# Altium footprint library Connector.PcbLib: 536 footprints (part 26 of 34)
Each footprint in its own frame and in the unit in brackets; x right, y up, seen from the top. Pads: shape width x height; smd on the part's side, far side on the other; paste and mask are expansions set on the pad; w line width, h text height; cw(c..) or ccw(c..) is an arc to the next point about the centre after c.
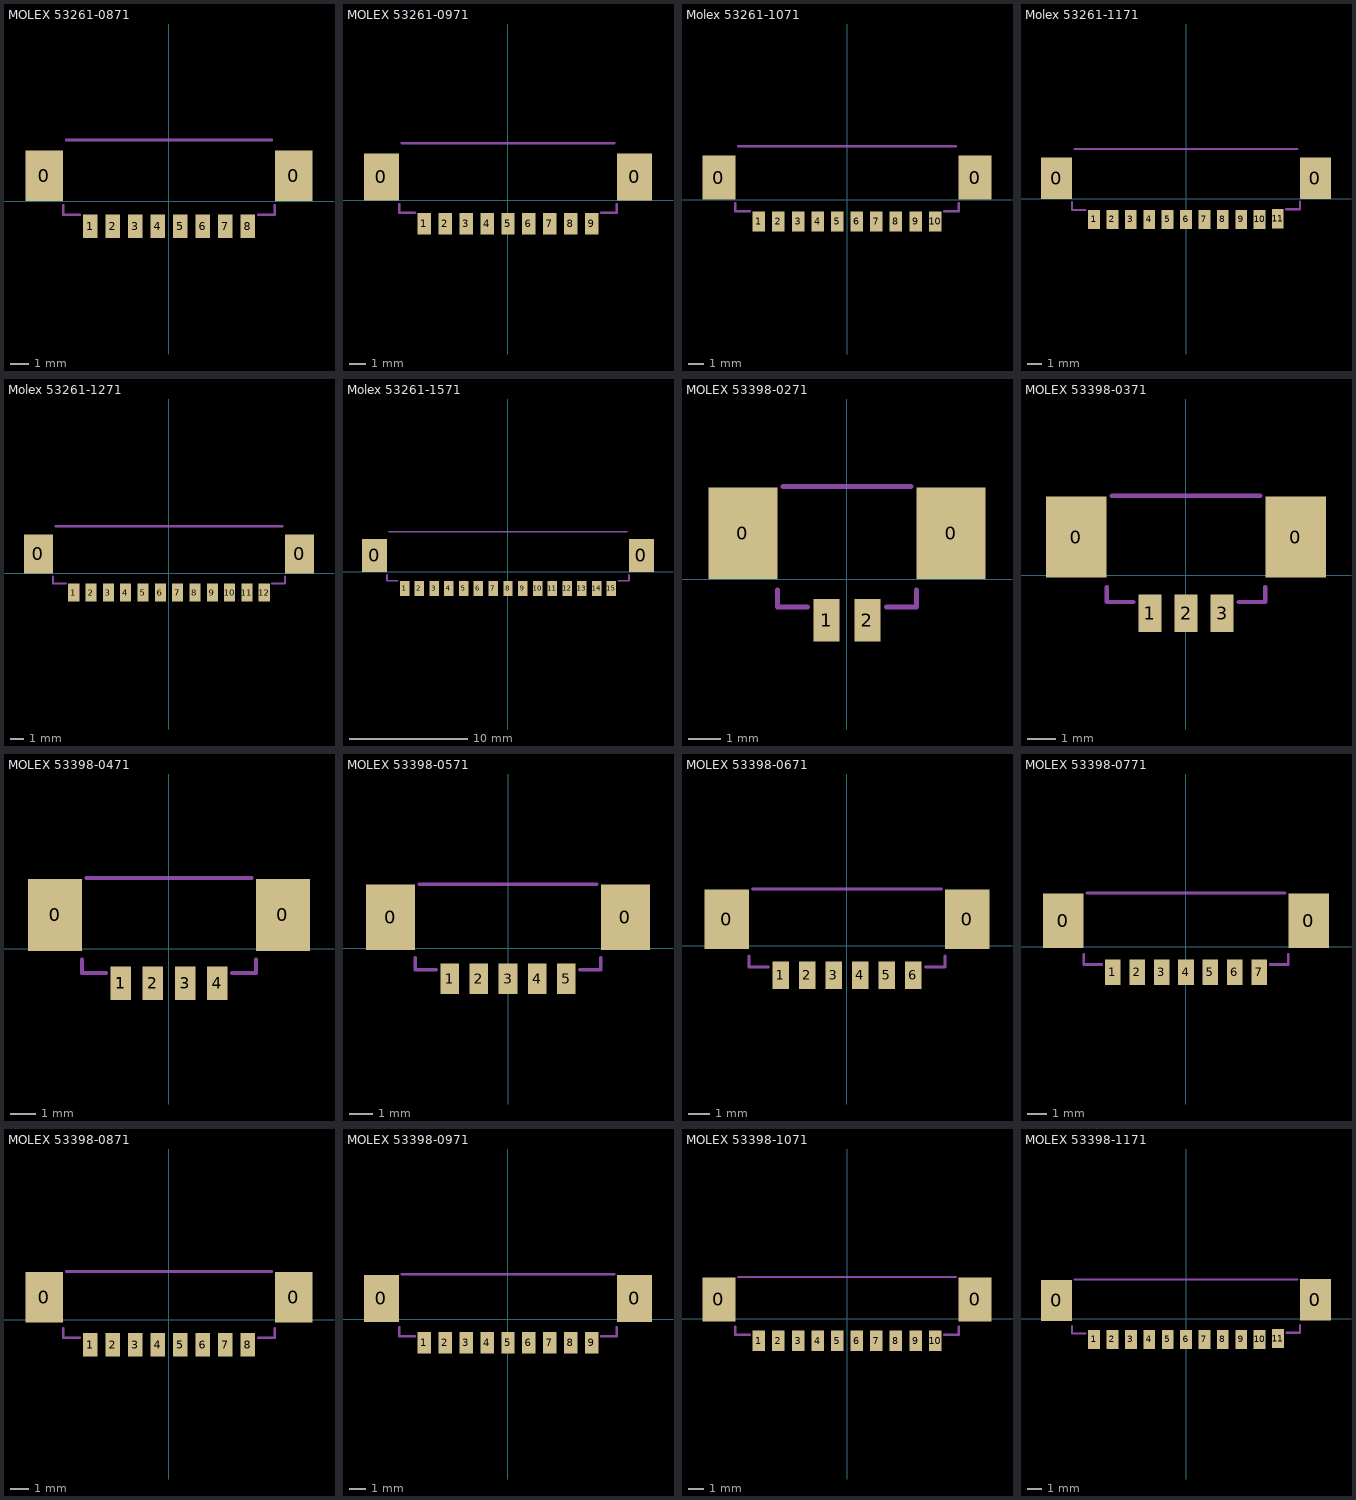
[diagram p25: the footprints below, top view; thin cyan lines are the x and y axes]

## MOLEX 53261-0871 [mm]
pads (10):
  rect 2.1x2.8 smd: 0(-6.925,1.4) 0(6.925,1.4)
  rect 0.8x1.3 smd: 1(-4.375,-1.4) 2(-3.125,-1.4) 3(-1.875,-1.4) 4(-0.625,-1.4) 5(0.625,-1.4) 6(1.875,-1.4) 7(3.125,-1.4) 8(4.375,-1.4)
Mechanical 15:
  lines w0.15: -5.874,-0.232 -5.874,-0.75 -4.95,-0.75 ; -5.7,3.394 5.7,3.394 ; 4.95,-0.75 5.874,-0.75 5.874,-0.232
3D body "532610871.stp": height 3.43, standoff 0.03, extent -7.575,-1.731 7.575,3.469

## MOLEX 53261-0971 [mm]
pads (11):
  rect 2.1x2.8 smd: 0(-7.55,1.4) 0(7.55,1.4)
  rect 0.8x1.3 smd: 1(-5,-1.4) 2(-3.75,-1.4) 3(-2.5,-1.4) 4(-1.25,-1.4) 5(0,-1.4) 6(1.25,-1.4) 7(2.5,-1.4) 8(3.75,-1.4) 9(5,-1.4)
Mechanical 15:
  lines w0.15: -6.499,-0.232 -6.499,-0.75 -5.575,-0.75 ; -6.325,3.394 6.325,3.394 ; 5.575,-0.75 6.499,-0.75 6.499,-0.232
3D body "532610971.stp": height 3.43, standoff 0.03, extent -8.2,-1.731 8.2,3.469

## Molex 53261-1071 [mm]
pads (12):
  rect 2.1x2.8 smd: 0(-8.175,1.4) 0(8.175,1.4)
  rect 0.8x1.3 smd: 1(-5.625,-1.4) 2(-4.375,-1.4) 3(-3.125,-1.4) 4(-1.875,-1.4) 5(-0.625,-1.4) 6(0.625,-1.4) 7(1.875,-1.4) 8(3.125,-1.4) 9(4.375,-1.4) 10(5.625,-1.4)
Mechanical 15:
  lines w0.15: -7.124,-0.232 -7.124,-0.75 -6.2,-0.75 ; -6.95,3.394 6.95,3.394 ; 6.2,-0.75 7.124,-0.75 7.124,-0.232
3D body "532611071.stp": height 3.43, standoff 0.03, extent -8.825,-1.731 8.825,3.469

## Molex 53261-1171 [mm]
pads (13):
  rect 2.1x2.8 smd: 0(-8.8,1.4) 0(8.8,1.4)
  rect 0.8x1.3 smd: 1(-6.25,-1.4) 2(-5,-1.4) 3(-3.75,-1.4) 4(-2.5,-1.4) 5(-1.25,-1.4) 6(0,-1.4) 7(1.25,-1.4) 8(2.5,-1.4) 9(3.75,-1.4) 10(5,-1.4) 11(6.245,-1.349)
Mechanical 15:
  lines w0.15: -7.749,-0.232 -7.749,-0.75 -6.825,-0.75 ; -7.575,3.394 7.575,3.394 ; 6.82,-0.699 7.743,-0.699 7.743,-0.181
3D body "532611171.stp": height 3.43, standoff 0.03, extent -9.45,-1.731 9.45,3.469

## Molex 53261-1271 [mm]
pads (14):
  rect 2.1x2.8 smd: 0(-9.425,1.4) 0(9.425,1.4)
  rect 0.8x1.3 smd: 1(-6.875,-1.4) 2(-5.625,-1.4) 3(-4.375,-1.4) 4(-3.125,-1.4) 5(-1.875,-1.4) 6(-0.625,-1.4) 7(0.625,-1.4) 8(1.875,-1.4) 9(3.125,-1.4) 10(4.375,-1.4) 11(5.625,-1.4) 12(6.875,-1.4)
Mechanical 15:
  lines w0.15: -8.374,-0.232 -8.374,-0.75 -7.45,-0.75 ; -8.2,3.394 8.2,3.394 ; 7.45,-0.75 8.374,-0.75 8.374,-0.232
3D body "532611271.stp": height 3.43, standoff 0.03, extent -10.075,-1.731 10.075,3.469

## Molex 53261-1571 [mm]
pads (17):
  rect 2.1x2.8 smd: 0(-11.3,1.4) 0(11.3,1.4)
  rect 0.8x1.3 smd: 1(-8.75,-1.4) 2(-7.5,-1.4) 3(-6.25,-1.4) 4(-5,-1.4) 5(-3.75,-1.4) 6(-2.5,-1.4) 7(-1.25,-1.4) 8(0,-1.4) 9(1.25,-1.4) 10(2.5,-1.4) 11(3.75,-1.4) 12(5,-1.4) 13(6.25,-1.4) 14(7.5,-1.4) 15(8.75,-1.4)
Mechanical 15:
  lines w0.15: -10.249,-0.232 -10.249,-0.75 -9.325,-0.75 ; -10.075,3.394 10.075,3.394 ; 9.325,-0.75 10.249,-0.75 10.249,-0.232
3D body "532611571.stp": height 3.33, standoff -0.07, extent -11.95,-1.731 11.95,3.469

## MOLEX 53398-0271 [mm]
pads (4):
  rect 2.1x2.8 smd: 0(-3.175,1.4) 0(3.175,1.4)
  rect 0.8x1.3 smd: 1(-0.625,-1.248) 2(0.625,-1.248)
Mechanical 15:
  lines w0.15: -2.124,-0.333 -2.124,-0.852 -1.2,-0.852 ; -1.95,2.827 1.95,2.827 ; 1.2,-0.852 2.124,-0.852 2.124,-0.333
3D body "533980271.stp": height 4.69, standoff -0.01, extent -3.825,-1.41 3.825,2.79

## MOLEX 53398-0371 [mm]
pads (5):
  rect 2.1x2.8 smd: 0(-3.8,1.324) 0(3.8,1.324)
  rect 0.8x1.3 smd: 1(-1.25,-1.324) 2(0,-1.324) 3(1.25,-1.324)
Mechanical 15:
  lines w0.15: -2.749,-0.41 -2.749,-0.928 -1.825,-0.928 ; -2.575,2.75 2.575,2.75 ; 1.825,-0.928 2.749,-0.928 2.749,-0.41
3D body "533980371.stp": height 4.69, standoff -0.01, extent -4.45,-1.486 4.45,2.714

## MOLEX 53398-0471 [mm]
height 1.35
pads (7):
  rect 2.1x2.8 smd: 0(-4.425,1.324) 0(4.425,1.324)
  rect 0.8x1.3 smd: 1(-1.875,-1.324) 1(-1.875,-1.324) 2(-0.625,-1.324) 3(0.625,-1.324) 4(1.875,-1.324)
Mechanical 15:
  lines w0.15: -3.374,-0.41 -3.374,-0.928 -2.45,-0.928 ; -3.2,2.75 3.2,2.75 ; 2.45,-0.928 3.374,-0.928 3.374,-0.41
3D body "533980471.stp": height 4.69, standoff -0.01, extent -5.075,-1.486 5.075,2.714

## MOLEX 53398-0571 [mm]
pads (7):
  rect 2.1x2.8 smd: 0(-5.05,1.324) 0(5.05,1.324)
  rect 0.8x1.3 smd: 1(-2.5,-1.324) 2(-1.25,-1.324) 3(0,-1.324) 4(1.25,-1.324) 5(2.5,-1.324)
Mechanical 15:
  lines w0.15: -3.999,-0.41 -3.999,-0.928 -3.075,-0.928 ; -3.825,2.75 3.825,2.75 ; 3.075,-0.928 3.999,-0.928 3.999,-0.41
3D body "533980571.stp": height 4.69, standoff -0.01, extent -5.7,-1.486 5.7,2.714

## MOLEX 53398-0671 [mm]
height 1.35
pads (8):
  rect 2.1x2.8 smd: 0(-5.675,1.248) 0(5.675,1.248)
  rect 0.8x1.3 smd: 1(-3.125,-1.4) 2(-1.875,-1.4) 3(-0.625,-1.4) 4(0.625,-1.4) 5(1.875,-1.4) 6(3.125,-1.4)
Mechanical 15:
  lines w0.15: -4.624,-0.486 -4.624,-1.004 -3.7,-1.004 ; -4.45,2.674 4.45,2.674 ; 3.7,-1.004 4.624,-1.004 4.624,-0.486
3D body "533980671.stp": height 4.69, standoff -0.01, extent -6.325,-1.562 6.325,2.638

## MOLEX 53398-0771 [mm]
pads (9):
  rect 2.1x2.8 smd: 0(-6.3,1.324) 0(6.3,1.324)
  rect 0.8x1.3 smd: 1(-3.75,-1.324) 2(-2.5,-1.324) 3(-1.25,-1.324) 4(0,-1.324) 5(1.25,-1.324) 6(2.5,-1.324) 7(3.75,-1.324)
Mechanical 15:
  lines w0.15: -5.249,-0.41 -5.249,-0.928 -4.325,-0.928 ; -5.075,2.75 5.075,2.75 ; 4.325,-0.928 5.249,-0.928 5.249,-0.41
3D body "533980771.stp": height 4.69, standoff -0.01, extent -6.95,-1.486 6.95,2.714

## MOLEX 53398-0871 [mm]
pads (10):
  rect 2.1x2.8 smd: 0(-6.925,1.248) 0(6.925,1.248)
  rect 0.8x1.3 smd: 1(-4.375,-1.4) 2(-3.125,-1.4) 3(-1.875,-1.4) 4(-0.625,-1.4) 5(0.625,-1.4) 6(1.875,-1.4) 7(3.125,-1.4) 8(4.375,-1.4)
Mechanical 15:
  lines w0.15: -5.874,-0.486 -5.874,-1.004 -4.95,-1.004 ; -5.7,2.674 5.7,2.674 ; 4.95,-1.004 5.874,-1.004 5.874,-0.486
3D body "533980871.stp": height 4.69, standoff -0.01, extent -7.575,-1.562 7.575,2.638

## MOLEX 53398-0971 [mm]
pads (11):
  rect 2.1x2.8 smd: 0(-7.55,1.248) 0(7.55,1.248)
  rect 0.8x1.3 smd: 1(-5,-1.4) 2(-3.75,-1.4) 3(-2.5,-1.4) 4(-1.25,-1.4) 5(0,-1.4) 6(1.25,-1.4) 7(2.5,-1.4) 8(3.75,-1.4) 9(5,-1.4)
Mechanical 15:
  lines w0.15: -6.499,-0.486 -6.499,-1.004 -5.575,-1.004 ; -6.325,2.674 6.325,2.674 ; 5.575,-1.004 6.499,-1.004 6.499,-0.486
3D body "533980971.stp": height 4.69, standoff -0.01, extent -8.2,-1.562 8.2,2.638

## MOLEX 53398-1071 [mm]
pads (12):
  rect 2.1x2.8 smd: 0(-8.175,1.248) 0(8.175,1.248)
  rect 0.8x1.3 smd: 1(-5.625,-1.4) 2(-4.375,-1.4) 3(-3.125,-1.4) 4(-1.875,-1.4) 5(-0.625,-1.4) 6(0.625,-1.4) 7(1.875,-1.4) 8(3.125,-1.4) 9(4.375,-1.4) 10(5.625,-1.4)
Mechanical 15:
  lines w0.15: -7.124,-0.486 -7.124,-1.004 -6.2,-1.004 ; -6.95,2.674 6.95,2.674 ; 6.2,-1.004 7.124,-1.004 7.124,-0.486
3D body "533981071.stp": height 4.69, standoff -0.01, extent -8.825,-1.562 8.825,2.638

## MOLEX 53398-1171 [mm]
pads (13):
  rect 2.1x2.8 smd: 0(-8.8,1.248) 0(8.795,1.298)
  rect 0.8x1.3 smd: 1(-6.25,-1.4) 2(-5,-1.4) 3(-3.75,-1.4) 4(-2.5,-1.4) 5(-1.25,-1.4) 6(0,-1.4) 7(1.25,-1.4) 8(2.5,-1.4) 9(3.75,-1.4) 10(5,-1.4) 11(6.245,-1.349)
Mechanical 15:
  lines w0.15: -7.749,-0.486 -7.749,-1.004 -6.825,-1.004 ; -7.575,2.674 7.575,2.674 ; 6.82,-0.953 7.743,-0.953 7.743,-0.435
3D body "533981171.stp": height 4.69, standoff -0.01, extent -9.45,-1.562 9.45,2.638